# Altium footprint library DD2088PoE_Daisy_Chain.PcbLib: 62 footprints (part 1 of 4)
Each footprint in its own frame and in the unit in brackets; x right, y up, seen from the top. Pads: shape width x height; smd on the part's side, far side on the other; paste and mask are expansions set on the pad; w line width, h text height; cw(c..) or ccw(c..) is an arc to the next point about the centre after c.
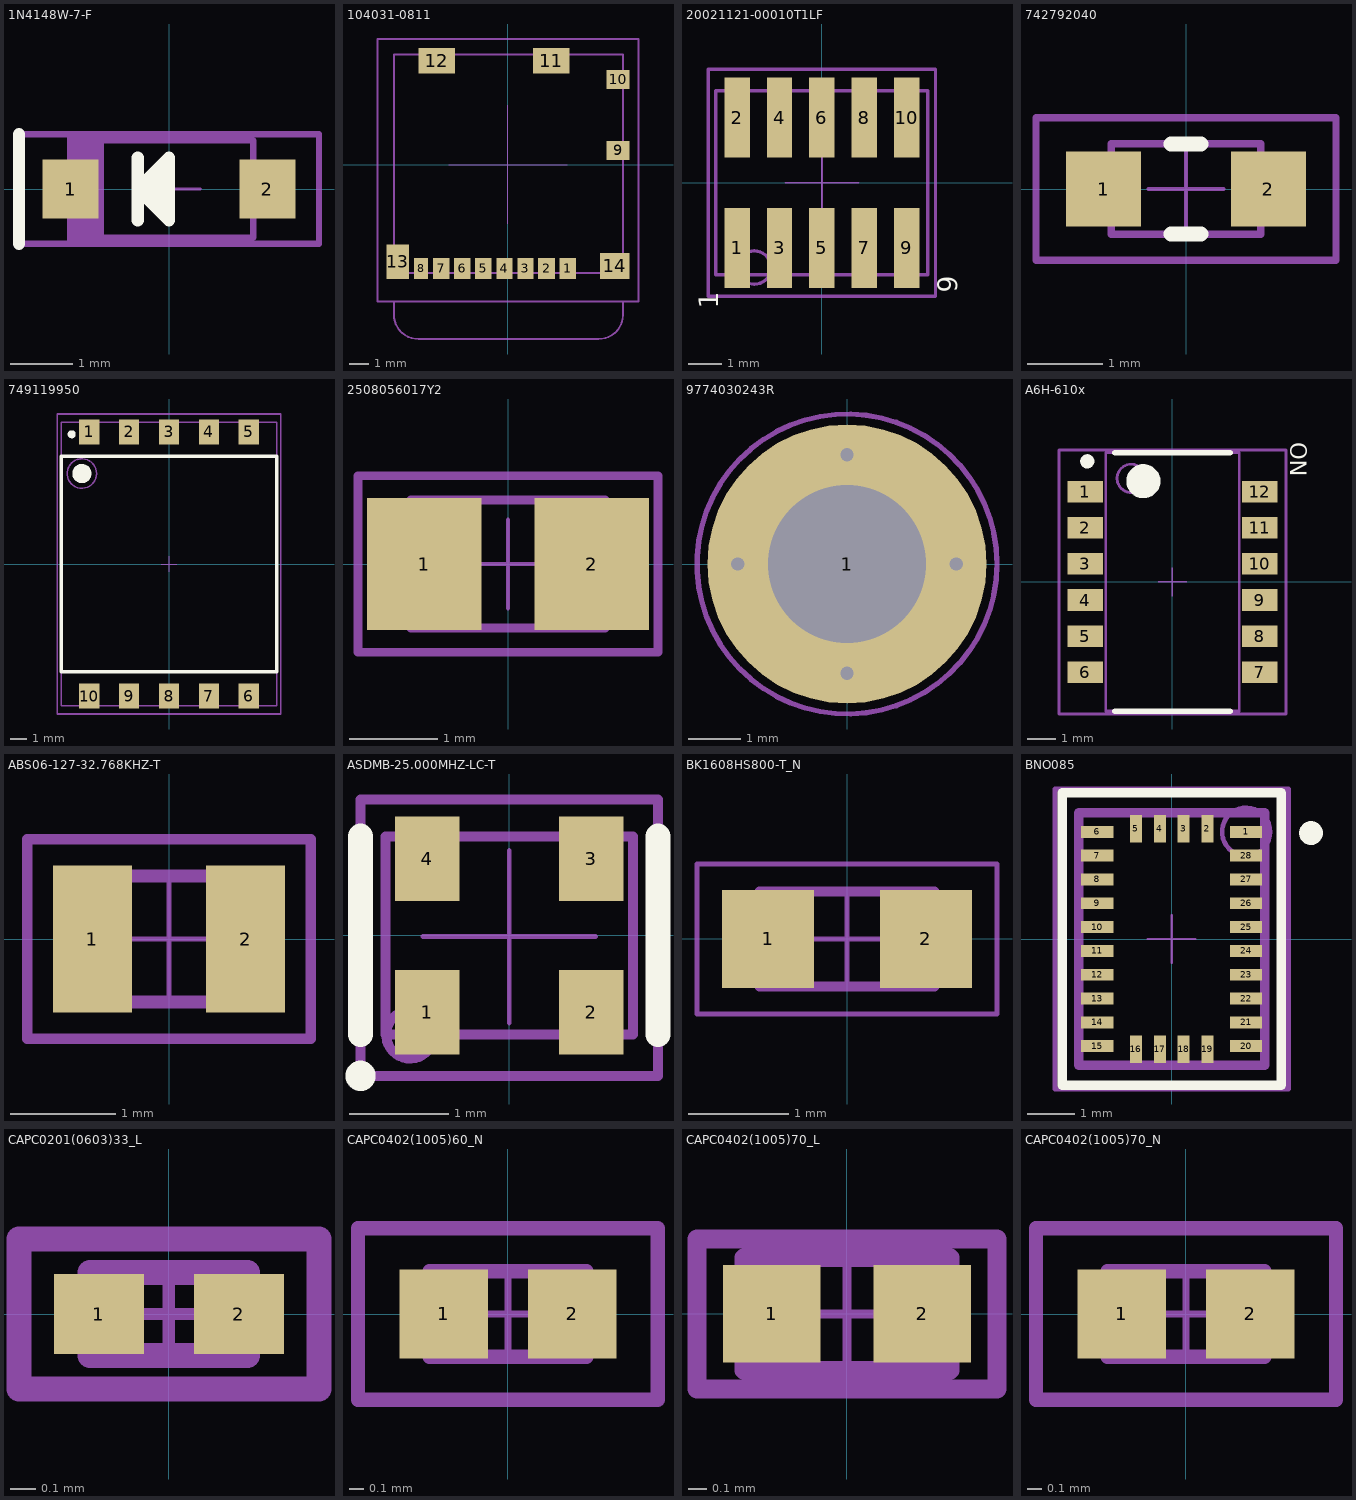
[diagram p0: the footprints below, top view; thin cyan lines are the x and y axes]

## 1N4148W-7-F [mm] "SOD123, 2-Leads, Body 2.7x1.55mm, Height 1.45mm"
height 1.45
pads (2):
  rect 0.9x0.95 smd: 1(-1.575,0) 2(1.575,0)
Top Overlay:
  region: 0,-0.5 0,0.5 -0.5,0
  lines w0.2: -2.4,-0.875 -2.4,0.875 ; -0.5,-0.5 -0.5,0 ; -0.5,0.5 -0.5,0 ; -0.5,0 0,0.5 0,-0.5 -0.5,0
Top Assembly:
  region: -1.044,-0.875 -1.044,0.875 -1.628,0.875 -1.628,-0.875
  lines w0.1: -2.4,-0.875 2.4,-0.875 2.4,0.875 -2.4,0.875 -2.4,-0.875
  text "'.Designator'" at -0.776,-0.4 h1
Top Courtyard:
  lines w0.05: -0.5,0 0.5,0 ; 0,-0.5 0,0.5 ; -2.4,-0.875 2.4,-0.875 2.4,0.875 -2.4,0.875 -2.4,-0.875
Top Component Outline:
  lines w0.1: -1.35,-0.775 -1.35,0.775 1.35,0.775 1.35,-0.775 -1.35,-0.775
3D body: height 1.45, standoff 0, extent -1.35,-0.775 1.35,0.775

## 104031-0811 [mm] "10 (8 + 2) Position Card Connector Secure Digital - microSD™ Surface Mount, Right Angle Gold"
height 1.42
pads (14):
  rect 0.85x1.1 smd: 1(3.113,-5.412) 3(0.913,-5.412) 4(-0.188,-5.412) 5(-1.288,-5.412) 6(-2.387,-5.412) 7(-3.487,-5.412)
  rect 0.875x1.1 smd: 2(2.013,-5.412)
  rect 0.75x1.1 smd: 8(-4.537,-5.412)
  rect 1.2x1 smd: 9(5.748,0.738) 10(5.748,4.438)
  rect 1.9x1.35 smd: 11(2.248,5.413) 12(-3.722,5.413)
  rect 1.17x1.8 smd: 13(-5.747,-5.062)
  rect 1.55x1.35 smd: 14(5.573,-5.287)
Top Assembly:
  lines w0.1: -5.95,-7.15 -5.95,-7.83 ccw(c-4.68,-7.83) -4.68,-9.1 -3.7,-9.1 4.73,-9.1 ccw(c4.73,-7.83) 6,-7.83 6,-7.15 ; -5.95,-7.15 -6.8,-7.15 -6.8,-6.75 -6.8,6.55 4.1,6.55 6.8,6.55 6.8,-5.412 6.8,-7.15 6,-7.15 ; -5.95,-7.15 6,-7.15
  text "'.Designator'" at -0.127,0.764 h1
Top Courtyard:
  lines w0.05: -3.1,0 0,0 ; 0,-3.1 0,0 ; 0,3.1 0,0 ; 3.1,0 0,0 ; -6.8,-7.15 -6.8,6.55 6.8,6.55 6.8,-7.15 -6.8,-7.15
Top Component Outline:
  lines w0.1: -5.95,-5.65 6,-5.65 6,5.75 -5.95,5.75 -5.95,-5.65
3D body "1040310811.stp": height 1.44, standoff -0.01, extent -5.95,-5.65 6,5.75

## 20021121-00010T1LF [mm] "Connector Header Surface Mount 10 position 0.050\" (1.27mm)   Contact length: 0.120\" (3.05mm)"
height 4
pads (10):
  rect 0.76x2.4 smd: 1(-2.54,-1.95) 2(-2.54,1.95) 3(-1.27,-1.95) 4(-1.27,1.95) 5(0,-1.95) 6(0,1.95) 7(1.27,-1.95) 8(1.27,1.95) 9(2.54,-1.95) 10(2.54,1.95)
Top Overlay:
  text "9" at 4.24,-3.3 h1
  text "1" at -2.91,-3.775 h1
Top Assembly:
  lines w0.1: -3.4,-3.4 -3.4,3.4 3.4,3.4 3.4,-3.4 -3.4,-3.4 ; -1.524,-2.54 ccw(c-2.024,-2.54) -1.524,-2.54
  text "'.Designator'" at 0.8,0.3 h1
Top Courtyard:
  lines w0.05: -1.1,0 0,0 ; 0,-1.1 0,0 ; 0,1.1 0,0 ; 1.1,0 0,0 ; -3.4,-3.4 3.4,-3.4 3.4,3.4 -3.4,3.4 -3.4,-3.4
Top Component Outline:
  lines w0.1: -3.184,-2.75 3.166,-2.75 3.166,2.75 -3.184,2.75 -3.184,-2.75
3D body "20021121-00010T1LF.stp": height 4.55, standoff 0, extent -3.184,-2.75 3.166,2.75

## 742792040 [mm] "Chip Inductor, 2-Leads, Body 2.0x1.2mm"
height 1.1
pads (2):
  rect 1x1 smd: 1(-1.1,0) 2(1.1,0)
Top Overlay:
  lines w0.1: 0,0.6 -0.2,0.6 ; -0.2,0.6 -0.2,0.6
  lines w0.2: -0.2,-0.6 0.2,-0.6 ; -0.2,0.6 0.2,0.6
Top Assembly:
  lines w0.1: -2,-0.95 2,-0.95 2,0.95 -2,0.95 -2,-0.95
  text "'.Designator'" at -0.8,-0.3 h1
Top Courtyard:
  lines w0.05: -0.5,0 0.5,0 ; 0,-0.5 0,0.5 ; -2,-0.95 2,-0.95 2,0.95 -2,0.95 -2,-0.95
Top Component Outline:
  lines w0.1: -1,-0.6 1,-0.6 1,0.6 -1,0.6 -1,-0.6
3D body "74279201.stp": height 0.89, standoff -0.01, extent -1,-0.6 1,0.6

## 749119950 [mm] "SMD, 10-Leads, Body 13.5x14.0mm (max), Pitch 2.48mm, IPC Medium Density"
height 12.5
pads (10):
  rect 1.27x1.55 smd: 1(-5,8.275) 2(-2.5,8.275) 3(0,8.275) 4(2.5,8.275) 5(5,8.275) 6(5,-8.275) 7(2.5,-8.275) 8(0,-8.275) 9(-2.5,-8.275) 10(-5,-8.275)
Top Overlay:
  circle w0.25: c-6.096,8.13 r0.125
  circle w0.6: c-5.461,5.669 r0.3
  lines w0.2: -6.75,-6.75 6.75,-6.75 6.75,6.75 -6.75,6.75 -6.75,-6.75
Top Assembly:
  circle w0.1: c-5.461,5.669 r0.921
  lines w0.1: -7,-9.4 7,-9.4 7,4.75 7,9.4 -7,9.4 -7,9.1 -7,-9.4
  text "'.Designator'" at 0.4,0.3 h1
Top Courtyard:
  lines w0.05: -0.5,0 0.5,0 ; 0,-0.5 0,0.5 ; -7,-9.4 7,-9.4 7,9.4 -7,9.4 -7,-9.4
Top Component Outline:
  lines w0.1: -6.75,-8.875 6.75,-8.875 6.75,8.875 -6.75,8.875 -6.75,-8.875
3D body "WE-PoE_EP13_PoE.stp": height 12.6, standoff 0.1, extent -6.75,-8.875 6.75,8.875

## 2508056017Y2 [mm] "2508056017Y2 Chip Inductor, 2-Leads, Body 2.00x1.25mm"
height 1.1
pads (2):
  rect 1.3x1.5 smd: 1(-0.95,0) 2(0.95,0)
Top Assembly:
  lines w0.1: -1.7,-1 -1.7,1 1.7,1 1.7,-1 -1.7,-1
  text "'.Designator'" at -0.55,-0.329 h1
Top Courtyard:
  lines w0.05: -0.5,0 0.5,0 ; 0,-0.5 0,0.5 ; -1.7,-1 1.7,-1 1.7,1 -1.7,1 -1.7,-1
Top Component Outline:
  lines w0.1: -1.1,-0.725 -1.1,0.725 1.1,0.725 1.1,-0.725 -1.1,-0.725
3D body: height 1.1, standoff 0, extent 0.6,-0.725 1.1,0.725
3D body: height 1.1, standoff 0, extent -1.1,-0.725 -0.6,0.725
3D body: height 1.1, standoff 0, extent -0.6,-0.725 0.6,0.725

## 9774030243R [mm] "STANDOFF_M2X0.4_3MM with no pad on bottom of PCB"
height 3
pads (1):
  round 5.3 / inner round 2.7 / far side round 2.7 hole 3 mask+0.05: 1(0,0)
via 0,2.075 diameter 0.508 hole 0.254
via 0,-2.075 diameter 0.508 hole 0.254
via -2.075,0 diameter 0.508 hole 0.254
via 2.075,0 diameter 0.508 hole 0.254
Top Paste:
  region: 0.317,2.581 0.278,1.576 0.397,1.55 0.628,1.471 0.845,1.359 1.042,1.214 1.214,1.042 1.359,0.845 1.471,0.628 1.55,0.397 1.576,0.278 2.581,0.317 2.554,0.531 2.432,0.946 2.242,1.334 1.991,1.686 1.686,1.991 1.334,2.242 0.946,2.432 0.531,2.554
  region: 2.581,-0.317 1.576,-0.278 1.55,-0.397 1.471,-0.628 1.359,-0.845 1.214,-1.042 1.042,-1.214 0.845,-1.359 0.628,-1.471 0.397,-1.55 0.278,-1.576 0.317,-2.581 0.531,-2.554 0.946,-2.432 1.334,-2.242 1.686,-1.991 1.991,-1.686 2.242,-1.334 2.432,-0.946 2.554,-0.531
  region: -0.317,-2.581 -0.278,-1.576 -0.397,-1.55 -0.628,-1.471 -0.845,-1.359 -1.042,-1.214 -1.214,-1.042 -1.359,-0.845 -1.471,-0.628 -1.55,-0.397 -1.576,-0.278 -2.581,-0.317 -2.554,-0.531 -2.432,-0.946 -2.242,-1.334 -1.991,-1.686 -1.686,-1.991 -1.334,-2.242 -0.946,-2.432 -0.531,-2.554
  region: -2.581,0.317 -1.576,0.278 -1.55,0.397 -1.471,0.628 -1.359,0.845 -1.214,1.042 -1.042,1.214 -0.845,1.359 -0.628,1.471 -0.397,1.55 -0.278,1.576 -0.317,2.581 -0.531,2.554 -0.946,2.432 -1.334,2.242 -1.686,1.991 -1.991,1.686 -2.242,1.334 -2.432,0.946 -2.554,0.531
Top Assembly:
  circle w0.1: c0,0 r2.85
  text "'.Designator'" at 0.776,0.4 h1
Top Courtyard:
  circle w0.05: c0,0 r2.85
  lines w0.05: -0.5,0 0.5,0 ; 0,-0.5 0,0.5
Bottom Courtyard:
  circle w0.05: c0,0 r2.85
Top Component Outline:
  circle w0.1: c0,0 r2.175
3D body "9774030243R (rev1).stp": height 3.05, standoff -1.35, extent -2.175,-2.172 2.175,2.172

## A6H-610x [mm] "DIP Sw, Std/SealTape Body 8.85x4.50mm, Pitch 1.27mm, IPC High Density"
height 1.55
pads (12):
  rect 1.25x0.76 smd: 1(-3.075,3.175) 2(-3.075,1.905) 3(-3.075,0.635) 4(-3.075,-0.635) 5(-3.075,-1.905) 6(-3.075,-3.175) 7(3.075,-3.175) 8(3.075,-1.905) 9(3.075,-0.635) 10(3.075,0.635) 11(3.075,1.905) 12(3.075,3.175)
Top Overlay:
  circle w0.25: c-3,4.25 r0.125
  circle w0.6: c-1.025,3.55 r0.3
  lines w0.2: -2.025,-4.55 2.025,-4.55 ; -2.025,4.55 2.025,4.55
  text "ON" at 3.953,4.917 h1
Top Assembly:
  circle w0.1: c-1.45,3.65 r0.5
  lines w0.1: -4,-4.65 -4,4.65 4,4.65 4,-4.65 -4,-4.65
  text "'.Designator'" at -0.776,-0.4 h1
Top Courtyard:
  lines w0.05: -0.5,0 0.5,0 ; 0,-0.5 0,0.5 ; -4,-4.65 -4,4.65 4,4.65 4,-4.65 -4,-4.65
Top Component Outline:
  lines w0.1: -2.35,-4.55 -2.35,4.55 2.35,4.55 2.35,-4.55 -2.35,-4.55
3D body "KAN1106Rx.stp": height 1.57, standoff 0, extent -3.35,-4.425 3.35,4.425

## ABS06-127-32.768KHZ-T [mm] "2-SMD 0.079\" L x 0.047\" W (2.00mm x 1.20mm)"
height 0.6
pads (2):
  rect 0.75x1.4 smd: 1(-0.73,0) 2(0.73,0)
Top Assembly:
  lines w0.1: -1.35,-0.95 -1.35,0.95 1.35,0.95 1.35,-0.95 -1.35,-0.95
  text "'.Designator'" at 0.086,-0.59 h1
Top Courtyard:
  lines w0.05: -0.6,0 0,0 ; 0,-0.6 0,0 ; 0,0.6 0,0 ; 0.6,0 0,0 ; -1.35,-0.95 -1.35,0.95 1.35,0.95 1.35,-0.95 -1.35,-0.95
Top Component Outline:
  lines w0.127: -1,-0.6 -1,0.6 1,0.6 1,-0.6 -1,-0.6
3D body "ABS06-32.768KHZ-9-T--3DModel-STEP-56544.STEP": height 0.65, standoff 0.05, extent -1,-0.6 1,0.6

## ASDMB-25.000MHZ-LC-T [mm] "0.098\" L x 0.079\" W (2.50mm x 2.00mm)"
height 0.9
pads (4):
  rect 0.65x0.85 smd: 1(-0.825,-0.775) 2(0.825,-0.775) 3(0.825,0.775) 4(-0.825,0.775)
Top Overlay:
  circle w0.254: c-1.5,-1.416 r0.025
  lines w0.254: -1.5,-1 -1.5,1 ; 1.5,-0.999 1.5,1
Top Assembly:
  circle w0.1: c-1,-1 r0.242
  lines w0.1: -1.5,-1.416 1.5,-1.416 1.5,1.37 -1.5,1.37 -1.5,-1.416
  text "'.Designator'" at 0.824,0.264 h1
Top Courtyard:
  lines w0.05: -0.87,-0.011 0,-0.011 ; 0,-0.881 0,-0.011 ; 0,0.859 0,-0.011 ; 0.87,-0.011 0,-0.011 ; -1.5,-1.416 1.5,-1.416 1.5,1.37 -1.5,1.37 -1.5,-1.416
Top Component Outline:
  lines w0.1: -1.25,-1 -1.25,1 1.25,1 1.25,-1 -1.25,-1
3D body "ASDMB.STEP": height 0.86, standoff 0.01, extent -1.25,-1 1.25,1

## BK1608HS800-T_N [mm] "Chip Inductor, 2-Leads, Body 1.60x0.80mm, IPC Medium Density"
height 0.95
pads (2):
  rect 0.92x0.98 smd: 1(-0.79,0) 2(0.79,0)
Top Assembly:
  lines w0.1: -0.875,-0.475 -0.875,0.475 0.875,0.475 0.875,-0.475 -0.875,-0.475
  text "'.Designator'" at 0.675,0.277 h1
Top Courtyard:
  lines w0.05: -0.475,0 0.475,0 ; 0,-0.475 0,0.475 ; -1.5,-0.75 -1.5,0.75 1.5,0.75 1.5,-0.75 -1.5,-0.75
3D body: height 0.95, standoff 0, extent -0.575,-0.475 0.575,0.475
3D body: height 0.95, standoff 0, extent -0.875,-0.475 -0.575,0.475
3D body: height 0.95, standoff 0, extent 0.575,-0.475 0.875,0.475

## BNO085 [mm] "28-TFLGA Module (5.2x3.8)"
height 1.18
pads (28):
  rect 0.675x0.25 smd paste+0 mask+0: 1(1.562,2.25) 6(-1.562,2.25) 7(-1.562,1.75) 8(-1.562,1.25) 9(-1.562,0.75) 10(-1.562,0.25) 11(-1.562,-0.25) 12(-1.562,-0.75) 13(-1.562,-1.25) 14(-1.562,-1.75) 15(-1.562,-2.25) 20(1.562,-2.25) 21(1.562,-1.75) 22(1.562,-1.25) 23(1.562,-0.75) 24(1.562,-0.25) 25(1.562,0.25) 26(1.562,0.75) 27(1.562,1.25) 28(1.562,1.75)
  rect 0.25x0.575 smd paste+0 mask+0: 2(0.75,2.312) 3(0.25,2.312) 4(-0.25,2.312) 5(-0.75,2.312) 16(-0.75,-2.312) 17(-0.25,-2.312) 18(0.25,-2.312) 19(0.75,-2.312)
Top Overlay:
  circle w0.25: c2.925,2.225 r0.125
  lines w0.2: -2.3,-3.075 -2.3,3.075 2.3,3.075 2.3,-3.075 -2.3,-3.075
Top Assembly:
  circle w0.1: c1.562,2.25 r0.505
  lines w0.1: -2.45,-3.15 -2.45,3.15 2.45,3.15 2.45,-3.15 -2.45,-3.15
  text "'.Designator'" at -0.837,0.091 h1
Top Courtyard:
  lines w0.05: -0.5,0 0.5,0 ; 0,-0.5 0,0.5 ; -2.45,-3.15 -2.45,3.15 2.45,3.15 2.45,-3.15 -2.45,-3.15
Top Component Outline:
  lines w0.2: -1.95,-2.65 -1.95,2.65 1.95,2.65 1.95,-2.65 -1.95,-2.65
3D body "IC_Hillcrest_Laboratories_Inc_BNO085_eec.STEP": height 1.18, standoff 0, extent -1.9,-2.6 1.9,2.6

## CAPC0201(0603)33_L [mm] "Chip Capacitor, Body 0.6x0.3mm, Height 0.33mm, IPC High Density"
height 0.33
pads (2):
  rect 0.36x0.32 smd: 1(-0.28,0) 2(0.28,0)
Top Assembly:
  lines w0.1: -0.6,-0.3 -0.6,0.3 0.6,0.3 0.6,-0.3 -0.6,-0.3
  text "'.Designator'" at -1.952,-0.192 h0.75
Top Courtyard:
  lines w0.05: -0.165,0 0.165,0 ; 0,-0.165 0,0.165 ; -0.6,-0.3 -0.6,0.3 0.6,0.3 0.6,-0.3 -0.6,-0.3
Top Component Outline:
  lines w0.1: -0.315,-0.165 0.315,-0.165 0.315,0.165 -0.315,0.165 -0.315,-0.165
3D body: height 0.33, standoff 0, extent 0.165,-0.165 0.315,0.165
3D body: height 0.33, standoff 0, extent -0.315,-0.165 -0.165,0.165
3D body: height 0.33, standoff 0, extent -0.165,-0.165 0.165,0.165

## CAPC0402(1005)60_N [mm] "Chip Capacitor, Body 1.0x0.5mm, Height 0.6mm, IPC Medium Density"
height 0.6
pads (2):
  rect 0.62x0.62 smd: 1(-0.45,0) 2(0.45,0)
Top Assembly:
  lines w0.1: -1.05,-0.6 -1.05,0.6 1.05,0.6 1.05,-0.6 -1.05,-0.6
  text "'.Designator'" at 0.758,0.29 h1
Top Courtyard:
  lines w0.05: -0.3,0 0.3,0 ; 0,-0.3 0,0.3 ; -1.049,-0.6 1.051,-0.6 1.051,0.6 -1.049,0.6 -1.049,-0.6
Top Component Outline:
  lines w0.1: -0.55,-0.3 0.55,-0.3 0.55,0.3 -0.55,0.3 -0.55,-0.3
3D body: height 0.6, standoff 0, extent -0.3,-0.3 0.3,0.3
3D body: height 0.6, standoff 0, extent -0.55,-0.3 -0.3,0.3
3D body: height 0.6, standoff 0, extent 0.3,-0.3 0.55,0.3

## CAPC0402(1005)70_L [mm] "Chip Capacitor, Body 1.0x0.5mm, Height 0.7mm, IPC High Density"
height 0.7
pads (2):
  rect 0.52x0.52 smd: 1(-0.4,0) 2(0.4,0)
Top Assembly:
  lines w0.1: -0.8,-0.4 -0.8,0.4 0.8,0.4 0.8,-0.4 -0.8,-0.4
  text "'.Designator'" at 0.815,0.262 h1
Top Courtyard:
  lines w0.05: -0.3,0 0.3,0 ; 0,-0.3 0,0.3 ; -0.8,-0.4 -0.8,0.4 0.8,0.4 0.8,-0.4 -0.8,-0.4
Top Component Outline:
  lines w0.1: -0.55,-0.3 -0.55,0.3 0.55,0.3 0.55,-0.3 -0.55,-0.3
3D body: height 0.7, standoff 0, extent 0.3,-0.3 0.55,0.3
3D body: height 0.7, standoff 0, extent -0.55,-0.3 -0.3,0.3
3D body: height 0.7, standoff 0, extent -0.3,-0.3 0.3,0.3

## CAPC0402(1005)70_N [mm] "Chip Capacitor, Body 1.0x0.5mm, Height 0.7mm, IPC Medium Density"
height 0.7
pads (2):
  rect 0.62x0.62 smd: 1(-0.45,0) 2(0.45,0)
Top Assembly:
  lines w0.1: -1.05,-0.6 -1.05,0.6 1.05,0.6 1.05,-0.6 -1.05,-0.6
  text "'.Designator'" at 0.753,0.307 h1
Top Courtyard:
  lines w0.05: -0.3,0 0.3,0 ; 0,-0.3 0,0.3 ; -1.05,-0.6 1.05,-0.6 1.05,0.6 -1.05,0.6 -1.05,-0.6
Top Component Outline:
  lines w0.1: -0.55,-0.3 -0.55,0.3 0.55,0.3 0.55,-0.3 -0.55,-0.3
3D body: height 0.7, standoff 0, extent -0.3,-0.3 0.3,0.3
3D body: height 0.7, standoff 0, extent -0.55,-0.3 -0.3,0.3
3D body: height 0.7, standoff 0, extent 0.3,-0.3 0.55,0.3